# Altium footprint library General_Lib.PcbLib: 729 footprints (part 34 of 46)
Each footprint in its own frame and in the unit in brackets; x right, y up, seen from the top. Pads: shape width x height; smd on the part's side, far side on the other; paste and mask are expansions set on the pad; w line width, h text height; cw(c..) or ccw(c..) is an arc to the next point about the centre after c.
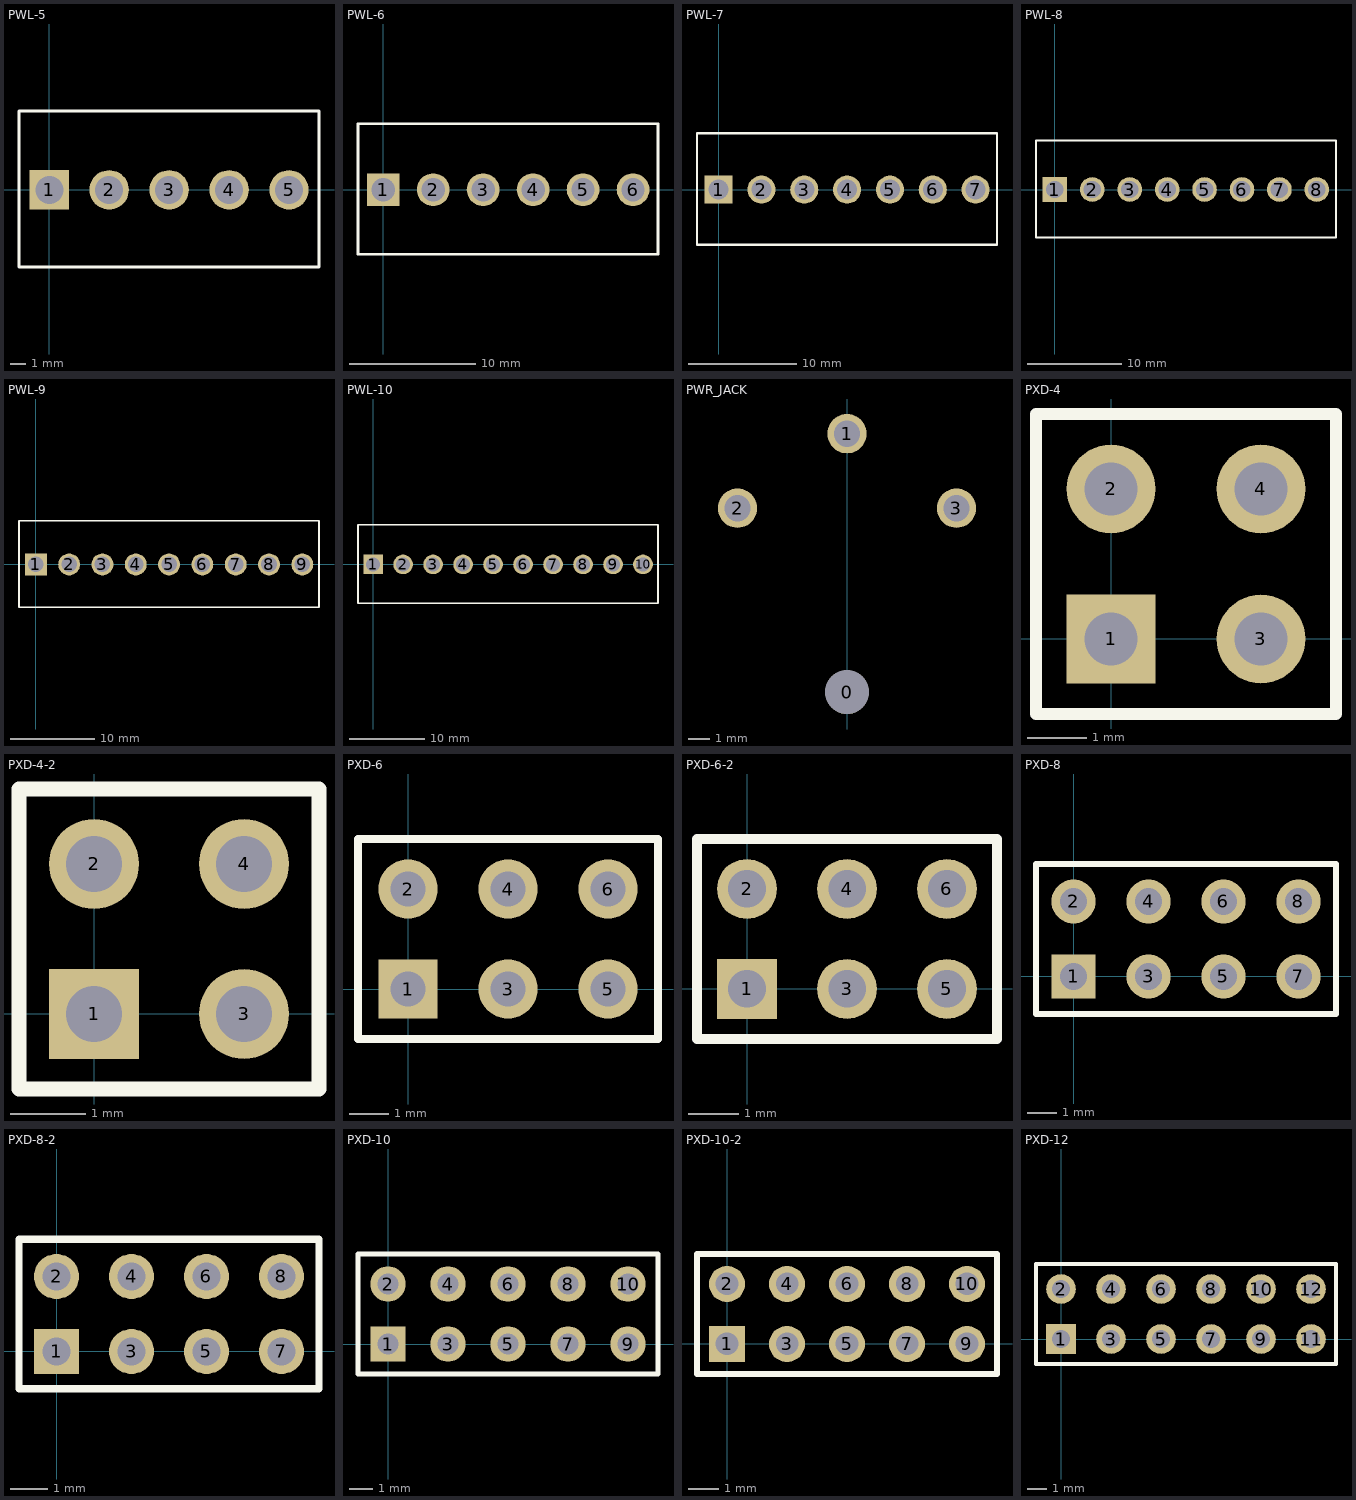
[diagram p33: the footprints below, top view; thin cyan lines are the x and y axes]

## PWL-5 [mm] "Connector; Header; 5 Position"
height 0.001
pads (5):
  rect 2.6x2.6 hole 1.85: 1(0,0)
  round 2.6 hole 1.85: 2(3.96,0) 3(7.92,0) 4(11.88,0) 5(15.84,0)
Top Overlay:
  lines w0.2: -2,-5.1 17.82,-5.1 17.82,5.207 -2,5.207 -2,-5.1
3D body "PWL-5.stp": height 13.5, standoff -4, extent -1.98,-5 17.82,5

## PWL-6 [mm] "Connector; Header; 6 Position"
height 0.001
pads (6):
  rect 2.6x2.6 hole 1.85: 1(0,0)
  round 2.6 hole 1.85: 2(3.96,0) 3(7.92,0) 4(11.88,0) 5(15.84,0) 6(19.8,0)
Top Overlay:
  lines w0.2: -2,-5.1 21.78,-5.1 21.78,5.207 -2,5.207 -2,-5.1
3D body "PWL-6.stp": height 13.5, standoff -4, extent -1.98,-5 21.78,5

## PWL-7 [mm] "Connector; Header; 7 Position"
height 0.001
pads (7):
  rect 2.6x2.6 hole 1.85: 1(0,0)
  round 2.6 hole 1.85: 2(3.96,0) 3(7.92,0) 4(11.88,0) 5(15.84,0) 6(19.8,0) 7(23.76,0)
Top Overlay:
  lines w0.2: -2,-5.1 25.74,-5.1 25.74,5.207 -2,5.207 -2,-5.1
3D body "PWL-7.stp": height 13.5, standoff -4, extent -1.98,-5 25.74,5

## PWL-8 [mm] "Connector; Header; 8 Position"
height 0.001
pads (8):
  rect 2.6x2.6 hole 1.85: 1(0,0)
  round 2.6 hole 1.85: 2(3.96,0) 3(7.92,0) 4(11.88,0) 5(15.84,0) 6(19.8,0) 7(23.76,0) 8(27.72,0)
Top Overlay:
  lines w0.2: -2,-5.1 -2,5.207 29.75,5.207 29.75,-5.1 -2,-5.1
3D body "PWL-8.stp": height 13.5, standoff -4, extent -1.962,-4.92 29.718,5.08

## PWL-9 [mm] "Connector; Header; 9 Position"
height 0.001
pads (9):
  rect 2.6x2.6 hole 1.85: 1(0,0)
  round 2.6 hole 1.85: 2(3.96,0) 3(7.92,0) 4(11.88,0) 5(15.84,0) 6(19.8,0) 7(23.76,0) 8(27.72,0) 9(31.68,0)
Top Overlay:
  lines w0.2: -2,-5.1 33.66,-5.1 33.66,5.207 -2,5.207 -2,-5.1
3D body "PWL-9.stp": height 13.5, standoff -4, extent -1.98,-5 33.66,5

## PWL-10 [mm] "Connector; Header; 10 Position"
height 0.001
pads (10):
  rect 2.6x2.6 hole 1.85: 1(0,0)
  round 2.6 hole 1.85: 2(3.96,0) 3(7.92,0) 4(11.88,0) 5(15.84,0) 6(19.8,0) 7(23.76,0) 8(27.72,0) 9(31.68,0) 10(35.64,0)
Top Overlay:
  lines w0.2: -2,-5.1 -2,5.207 37.62,5.207 37.62,-5.1 -2,-5.1
3D body "PWL-10.stp": height 13.5, standoff -4, extent -1.98,-5 37.62,5

## PWR_JACK [mm]
pads (4):
  round 2 hole 2 unplated: 0(0,3.5)
  round 1.8 hole 1.2: 1(0,15.3) 2(-5,11.9) 3(5,11.9)
3D body "PWR_JACK.STEP": height 11.03, standoff -2.97, extent -5.5,0 5.5,15.8

## PXD-4 [mm] "Connector; Header; 2x2 Position"
height 0.001
pads (4):
  rect 1.5x1.5 hole 0.9: 1(0,0)
  round 1.5 hole 0.9: 2(0,2.54) 3(2.54,0) 4(2.54,2.54)
Top Overlay:
  lines w0.2: -1.27,-1.27 -1.27,3.81 3.81,3.81 3.81,-1.27 -1.27,-1.27

## PXD-4-2 [mm] "Connector; Header; 2x2 Position"
height 0.001
pads (4):
  rect 1.2x1.2 hole 0.75: 1(0,0)
  round 1.2 hole 0.75: 2(0,2) 3(2,0) 4(2,2)
Top Overlay:
  lines w0.2: -1,-1 -1,3 3,3 3,-1 -1,-1

## PXD-6 [mm] "Connector; Header; 3x2 Position"
height 0.001
pads (6):
  rect 1.5x1.5 hole 0.9: 1(0,0)
  round 1.5 hole 0.9: 2(0,2.54) 3(2.54,0) 4(2.54,2.54) 5(5.08,0) 6(5.08,2.54)
Top Overlay:
  lines w0.2: -1.27,-1.27 -1.27,3.81 6.35,3.81 6.35,-1.27 -1.27,-1.27

## PXD-6-2 [mm] "Connector; Header; 3x2 Position"
height 0.001
pads (6):
  rect 1.2x1.2 hole 0.75: 1(0,0)
  round 1.2 hole 0.75: 2(0,2) 3(2,0) 4(2,2) 5(4,0) 6(4,2)
Top Overlay:
  lines w0.2: -1,-1 5,-1 5,3 -1,3 -1,-1

## PXD-8 [mm] "Connector; Header; 4x2 Position"
height 0.001
pads (8):
  rect 1.5x1.5 hole 0.9: 1(0,0)
  round 1.5 hole 0.9: 2(0,2.54) 3(2.54,0) 4(2.54,2.54) 5(5.08,0) 6(5.08,2.54) 7(7.62,0) 8(7.62,2.54)
Top Overlay:
  lines w0.2: -1.27,-1.27 8.89,-1.27 8.89,3.81 -1.27,3.81 -1.27,-1.27

## PXD-8-2 [mm] "Connector; Header; 4x2 Position"
height 0.001
pads (8):
  rect 1.2x1.2 hole 0.75: 1(0,0)
  round 1.2 hole 0.75: 2(0,2) 3(2,0) 4(2,2) 5(4,0) 6(4,2) 7(6,0) 8(6,2)
Top Overlay:
  lines w0.2: -1,-1 7,-1 7,3 -1,3 -1,-1

## PXD-10 [mm] "Connector; Header; 5x2 Position"
height 0.001
pads (10):
  rect 1.5x1.5 hole 0.9: 1(0,0)
  round 1.5 hole 0.9: 2(0,2.54) 3(2.54,0) 4(2.54,2.54) 5(5.08,0) 6(5.08,2.54) 7(7.62,0) 8(7.62,2.54) 9(10.16,0) 10(10.16,2.54)
Top Overlay:
  lines w0.2: -1.27,-1.27 11.43,-1.27 11.43,3.81 -1.27,3.81 -1.27,-1.27

## PXD-10-2 [mm] "Connector; Header; 5x2 Position"
height 0.001
pads (10):
  rect 1.2x1.2 hole 0.75: 1(0,0)
  round 1.2 hole 0.75: 2(0,2) 3(2,0) 4(2,2) 5(4,0) 6(4,2) 7(6,0) 8(6,2) 9(8,0) 10(8,2)
Top Overlay:
  lines w0.2: -1,-1 9,-1 9,3 -1,3 -1,-1

## PXD-12 [mm] "Connector; Header; 6x2 Position"
height 0.001
pads (12):
  rect 1.5x1.5 hole 0.9: 1(0,0)
  round 1.5 hole 0.9: 2(0,2.54) 3(2.54,0) 4(2.54,2.54) 5(5.08,0) 6(5.08,2.54) 7(7.62,0) 8(7.62,2.54) 9(10.16,0) 10(10.16,2.54) 11(12.7,0) 12(12.7,2.54)
Top Overlay:
  lines w0.2: -1.27,-1.27 -1.27,3.81 13.97,3.81 13.97,-1.27 -1.27,-1.27